# Altium footprint library 元件1.PcbLib: 420 footprints (part 1 of 27)
Each footprint in its own frame and in the unit in brackets; x right, y up, seen from the top. Pads: shape width x height; smd on the part's side, far side on the other; paste and mask are expansions set on the pad; w line width, h text height; cw(c..) or ccw(c..) is an arc to the next point about the centre after c.
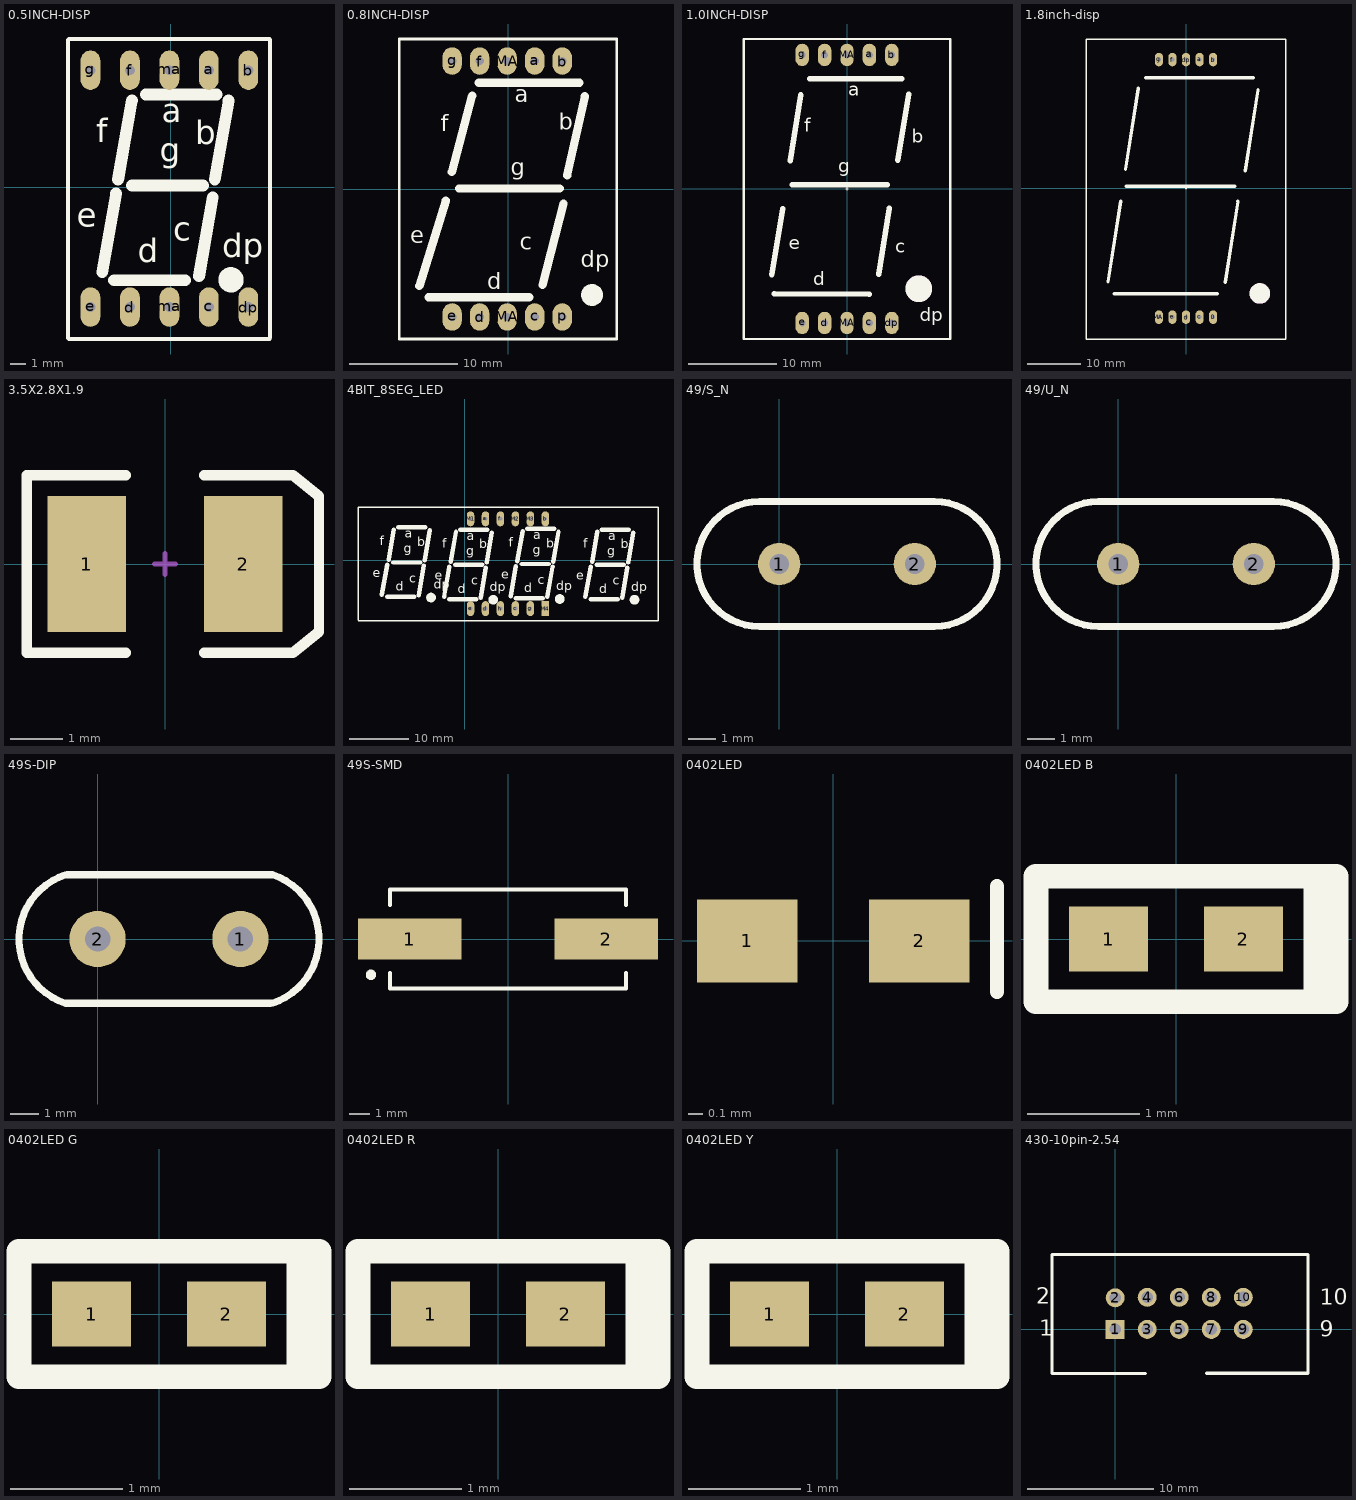
[diagram p0: the footprints below, top view; thin cyan lines are the x and y axes]

## 0.5INCH-DISP [mil]
pads (10):
  oval 50x100 hole 25: a(97,297) b(197,297) c(97,-303) d(-103,-303) dp(197,-303) e(-203,-303) f(-103,297) g(-203,297) ma(-3,-303) ma(-3,297)
Top Overlay:
  circle w40: c153,-234 r12
  lines w10: -260,-382 -260,374 ; -258,-384 251,-384 ; -258,376 251,376 ; 252,-380 252,374
  lines w30: -173,-215 -138,-15 ; -143,-235 37,-235 ; -133,20 -98,220 ; -98,5 82,5 ; -63,235 117,235 ; 72,-225 107,-25 ; 112,20 147,220
  text "f" at -188,115 h60
  text "b" at 62,110 h60
  text "g" at -28,65 h60
  text "a" at -23,165 h60
  text "d" at -83,-190 h60
  text "e" at -238,-100 h60
  text "dp" at 131,-177 h60
  text "c" at 7,-135 h60
3D body "0.5INCH-DISP.STEP": height 393.7, standoff 0, extent -257,-381.03 254.81,367

## 0.8INCH-DISP [mil]
pads (10):
  oval 70x100 hole 30: a(97,465) b(197,465) c(97,-465) d(-103,-465) e(-203,-465) f(-103,465) g(-203,465) MA(-3,-465) MA(-3,465) p(197,-465)
Top Overlay:
  circle w40: c305.31,-385 r19.68
  lines w10: -395,-545 395,-545 395,545 -395,545 -395,-545
  lines w30: -322,-352 -226,-42 ; -289,-393 77.14,-393 ; -204,62 -130,339 ; -177.68,2.24 188.47,2.24 ; -108,-478 -103,-473 ; -106.14,386 260,386 ; 125,-349 202,-53 ; 215,49 279,337
  text "b" at 185,215 h60
  text "dp" at 265,-285 h60
  text "f" at -245,210 h60
  text "e" at -355,-198 h60
  text "d" at -75,-365 h60
  text "c" at 43,-220 h60
  text "g" at 10,50 h60
  text "a" at 25,315 h60
3D body "0.8INCH-DISP.STEP": height 393.7, standoff 0, extent -395,-531.49 392.4,531.5

## 1.0INCH-DISP [mil]
pads (10):
  oval 60x100 hole 30: a(100,598) b(200,598) c(100,-598) d(-100,-598) dp(200,-598) e(-200,-598) f(-100,598) g(-200,598) MA(0,-598) MA(0,598)
Top Overlay:
  lines w2: -6,0 6,0 ; 0,-6 0,5
  lines w10: -461,-10 -461,10 ; -460.88,-669.58 -460.88,669 ; -459.88,-669.58 461,-669.58 461,669 -459.88,669
  lines w25: -335,-382 -287,-89 ; -324,-467 99,-470 ; -254,126 -206,419 ; -244,19 179,19 ; -167,492 245,492 ; 141,-380 189,-87 ; 227,129 275,422
  text "a" at 5,415 h60
  text "b" at 290,205 h60
  text "c" at 215,-285 h60
  text "d" at -150,-430 h60
  text "e" at -260,-270 h60
  text "f" at -190,255 h60
  text "dp" at 325,-590 h60
  text "g" at -40,75 h60
Top Overlay keep-out:
  circle w100: c320.57,-445 r9.43
3D body "1.0INCH-DISP.STEP": height 393.7, standoff 0, extent -454,-654 451.51,645.22

## 1.8inch-disp [mil]
pads (10):
  oval 60x100 hole 30: 0(200,-950) a(100,950) b(200,950) c(100,-950) d(0,-950) dp(0,950) e(-100,-950) f(-100,950) g(-200,950) MA(-200,-950)
Top Overlay:
  lines w2: -5,0 5,0 ; 0,-5 0,4
  lines w10: -736,-1111 -736,1101.6 736,1101.6 736,-1111 -736,-1111
  lines w25: -575,-691 -481,-93 ; -528,-778 230,-778 ; -446,139 -352,737 ; -442,15 359,15 ; -299,815 496,815 ; 289,-694 383,-96 ; 437,128 531,726
Top Overlay keep-out:
  circle w100: c544.39,-775 r25.61
3D body "1.8inch-disp.STEP": height 393.7, standoff 0, extent -733,-1106.36 723.7,1098.36

## 3.5X2.8X1.9 [mm] "SM LED; 2 C-Bend Leads; Body 3.5 x 2.8 x 1.9 mm, inc leads (LxWxH typ)"
height 1.9
pads (2):
  rect 1.5x2.6 smd: 1(-1.5,0) 2(1.5,0)
Top Overlay:
  lines w0.2: -0.75,-1.7 -2.65,-1.7 -2.65,1.7 -0.75,1.7 ; 0.75,-1.7 2.45,-1.7 2.95,-1.3 2.95,1.3 2.45,1.7 0.75,1.7
Mechanical 1:
  lines w0.1: -0.2,0 0.2,0 ; 0,-0.2 0,0.2
3D body "smtled2.STEP": height 1.6, standoff 0, extent -2.373,-1.651 2.627,1.649

## 4BIT_8SEG_LED [mil]
pads (12):
  oval 50x100 hole 25: a(137,277) b(537,277) c(337,-323) d(137,-323) e(37,-323) f(237,277) g(437,-323) h(237,-323) M1(37,277) M2(337,277) M3(437,277)
  rect 50x100 hole 25: M4(537,-323)
Top Overlay:
  circle w40: c188,-264 r12
  circle w40: c-227,-249 r12
  circle w40: c633,-259 r12
  circle w40: c1133,-264 r12
  lines w10: -715,-405 1290,-405 ; -715,-401 -715,355 1290,355 1290,-404
  lines w30: -555,-230 -520,-30 ; -520,-245 -340,-245 ; -510,5 -475,205 ; -480,-15 -300,-15 ; -445,220 -265,220 ; -310,-235 -275,-35 ; -270,0 -235,200 ; -140,-245 -105,-45 ; -105,-260 75,-260 ; -95,-10 -60,190 ; -65,-30 115,-30 ; -30,205 150,205 ; 105,-250 140,-50 ; 145,-15 180,185 ; 305,-240 340,-40 ; 340,-255 520,-255 ; 350,-5 385,195 ; 380,-25 560,-25 ; 415,210 595,210 ; 550,-245 585,-45 ; 590,-10 625,190 ; 805,-245 840,-45 ; 840,-260 1020,-260 ; 850,-10 885,190 ; 880,-30 1060,-30 ; 915,205 1095,205 ; 1050,-250 1085,-50 ; 1090,-15 1125,185
  text "c" at 42,-165 h60
  text "dp" at 166,-207 h60
  text "e" at -203,-130 h60
  text "d" at -48,-220 h60
  text "a" at 12,135 h60
  text "g" at 7,35 h60
  text "b" at 97,80 h60
  text "f" at -153,85 h60
  text "c" at -373,-150 h60
  text "dp" at -209,-192 h60
  text "e" at -618,-115 h60
  text "d" at -463,-205 h60
  text "a" at -403,150 h60
  text "g" at -408,50 h60
  text "b" at -318,95 h60
  text "f" at -568,100 h60
  text "c" at 487,-160 h60
  text "dp" at 611,-202 h60
  text "e" at 242,-125 h60
  text "d" at 397,-215 h60
  text "a" at 457,140 h60
  text "g" at 452,40 h60
  text "b" at 542,85 h60
  text "f" at 292,90 h60
  text "c" at 987,-165 h60
  text "dp" at 1111,-207 h60
  text "e" at 742,-130 h60
  text "d" at 897,-220 h60
  text "a" at 957,135 h60
  text "g" at 952,35 h60
  text "b" at 1042,80 h60
  text "f" at 792,85 h60
3D body "4BIT_8SEG_LED.STEP": height 393.7, standoff 0, extent -736.62,-401 1310.62,347.03

## 49/S_N [mil] "短型晶振（未加焊）"
pads (2):
  round 60 hole 28: 1(0,0) 2(192,0)
Top Overlay:
  lines w10: -28,-88.5 cw(c-28,0) -28,88.5 220,88.5 cw(c220,0) 220,-88.5 -28,-88.5
3D body "hc-49s_n.stp": height 137.8, standoff -118.11, extent -116.14,-89.37 309.06,87.8

## 49/U_N [mil] "高型晶振（未加焊）"
pads (2):
  round 60 hole 28: 1(0,0) 2(192,0)
Top Overlay:
  lines w10: -28,-88.5 cw(c-28,0) -28,88.5 220,88.5 cw(c220,0) 220,-88.5 -28,-88.5
3D body "hc-49u_n.stp": height 511.81, standoff -118.11, extent -116.54,-88.39 308.66,88.78

## 49S-DIP [mm]
pads (2):
  round 2 hole 0.9: 1(5.08,0) 2(0,0)
Top Overlay:
  lines w0.254: -1.144,-2.289 cw(c-0.391,-0.003) -1.142,2.283 ; -1.143,-2.286 6.144,-2.286 ; -1.09,2.286 6.223,2.286 ; 6.222,-2.283 ccw(c5.471,0.003) 6.224,2.289
3D body "SW3dPS-HP49US.STEP": height 3.5, standoff -4, extent -3.092,-2.331 8.258,2.319

## 49S-SMD [mm]
pads (2):
  rect 5x2 smd: 1(-4.75,0) 2(4.75,0)
Top Overlay:
  circle w0.25: c-6.625,-1.73 r0.125
  lines w0.2: -5.7,-1.65 -5.7,-2.4 5.7,-2.4 5.7,-1.65 ; -5.7,1.65 -5.7,2.4 5.7,2.4 5.7,1.65
3D body "User Library-hc49_cystal.STEP": height 4, standoff 0, extent -6.7,-2.462 6.7,2.438

## 0402LED [mm]
pads (2):
  rect 0.7x0.58 smd: 1(-0.6,0) 2(0.6,0)
Top Overlay:
  lines w0.1: 1.143,-0.356 1.143,0.381
3D body "User Library-led_0402LED0402 green.STEP": height 0.45, standoff 0, extent -0.505,-0.25 0.505,0.25

## 0402LED B [mm]
pads (2):
  rect 0.7x0.58 smd: 1(-0.6,0) 2(0.6,0)
Top Overlay:
  lines w0.22: 1.245,-0.559 -1.245,-0.559 -1.245,0.559 1.245,0.559 ; 1.245,-0.559 1.245,0.559 ; 1.245,-0.559 1.422,-0.559 1.422,0.559 1.245,0.559 ; 1.245,-0.559 1.245,0.559
3D body "User Library-led_0402LED0402 blue.STEP": height 0.45, standoff 0, extent -0.505,-0.25 0.505,0.25

## 0402LED G [mm]
pads (2):
  rect 0.7x0.58 smd: 1(-0.6,0) 2(0.6,0)
Top Overlay:
  lines w0.22: 1.245,-0.559 1.245,0.559 ; 1.245,-0.559 1.422,-0.559 1.422,0.559 1.245,0.559 ; 1.245,-0.559 1.245,0.559 ; 1.245,-0.559 1.245,0.559 ; 1.245,-0.559 -1.245,-0.559 -1.245,0.559 1.245,0.559
3D body "User Library-led_0402LED0402 green.STEP": height 0.45, standoff 0, extent -0.505,-0.25 0.505,0.25

## 0402LED R [mm]
pads (2):
  rect 0.7x0.58 smd: 1(-0.6,0) 2(0.6,0)
Top Overlay:
  lines w0.22: 1.245,-0.559 1.422,-0.559 1.422,0.559 1.245,0.559 ; 1.245,-0.559 -1.245,-0.559 -1.245,0.559 1.245,0.559 ; 1.245,-0.559 1.245,0.559
3D body "User Library-led_0402.STEP": height 0.45, standoff 0, extent -0.505,-0.25 0.505,0.25

## 0402LED Y [mm]
pads (2):
  rect 0.7x0.58 smd: 1(-0.6,0) 2(0.6,0)
Top Overlay:
  lines w0.22: 1.245,-0.559 1.245,0.559 ; 1.245,-0.559 1.422,-0.559 1.422,0.559 1.245,0.559 ; 1.245,-0.559 -1.245,-0.559 -1.245,0.559 1.245,0.559 ; 1.245,-0.559 1.245,0.559
3D body "User Library-led_0402LED0402 yellow.STEP": height 0.45, standoff 0, extent -0.505,-0.25 0.505,0.25

## 430-10pin-2.54 [mm] "牛角座"
pads (10):
  rect 1.5x1.5 hole 0.9: 1(0,0)
  round 1.5 hole 0.9: 2(0,2.5) 3(2.54,0) 4(2.54,2.54) 5(5.08,0) 6(5.08,2.54) 7(7.62,0) 8(7.62,2.54) 9(10.16,0) 10(10.16,2.54)
Top Overlay:
  lines w0.254: 2.388,-3.505 -5,-3.505 -5,5.944 15.291,5.944 15.291,-3.48 7.264,-3.48
  text "9" at 16.233,-0.584 h1.27
  text "10" at 16.233,1.956 h1.27
  text "1" at -6,-0.5 h1.27
  text "2" at -6.274,2.032 h1.27
3D body "Header 2_54mm 10 Pin.step": height 9.86, standoff -3.05, extent -5.055,-3.353 15.265,5.791